# Altium footprint library Face_InMain1V0.PcbLib: 83 footprints (part 2 of 6)
Each footprint in its own frame and in the unit in brackets; x right, y up, seen from the top. Pads: shape width x height; smd on the part's side, far side on the other; paste and mask are expansions set on the pad; w line width, h text height; cw(c..) or ccw(c..) is an arc to the next point about the centre after c.
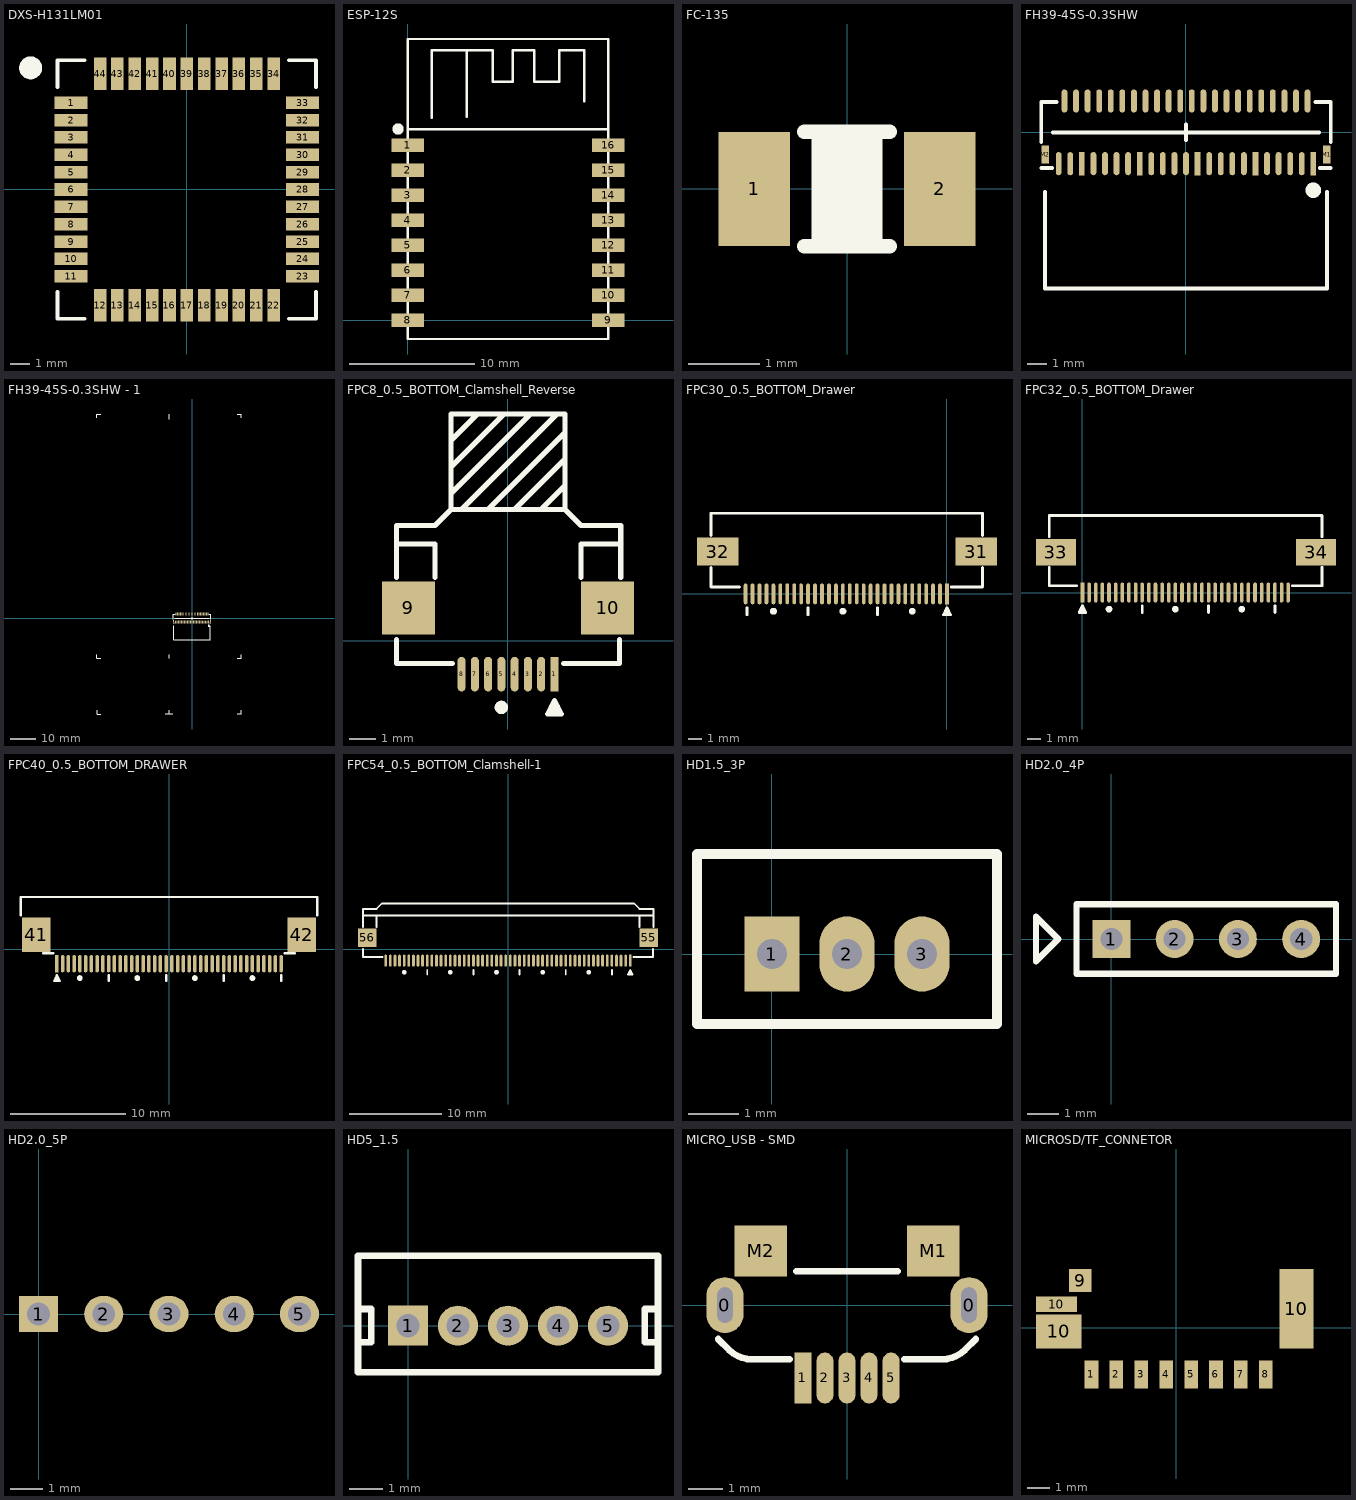
[diagram p1: the footprints below, top view; thin cyan lines are the x and y axes]

## DXS-H131LM01 [mm] "DXS-H131LM01"
height 6.3
pads (45):
  rect 1.7x0.65 smd paste+0 mask+0: 1(-6,4.5) 2(-6,3.6) 3(-6,2.7) 4(-6,1.8) 5(-6,0.9) 6(-6,0) 7(-6,-0.9) 8(-6,-1.8) 9(-6,-2.7) 10(-6,-3.6) 11(-6,-4.5) 23(6,-4.5) 24(6,-3.6) 25(6,-2.7) 26(6,-1.8) 27(6,-0.9) 28(6,0) 29(6,0.9) 30(6,1.8) 31(6,2.7) 32(6,3.6) 33(6,4.5)
  rect 0.65x1.7 smd paste+0 mask+0: 12(-4.5,-6) 13(-3.6,-6) 14(-2.7,-6) 15(-1.8,-6) 16(-0.9,-6) 17(0,-6) 18(0.9,-6) 19(1.8,-6) 20(2.7,-6) 21(3.6,-6) 22(4.5,-6) 34(4.5,6) 35(3.6,6) 36(2.7,6) 37(1.8,6) 38(0.9,6) 39(0,6) 40(-0.9,6) 41(-1.8,6) 42(-2.7,6) 43(-3.6,6) 44(-4.5,6)
  round 1.2 on Top Overlay paste+0 mask+0: ""(-8.1,6.3)
Top Overlay:
  lines w0.2: -6.7,-5.3 -6.7,-6.7 -5.3,-6.7 ; -6.7,5.3 -6.7,6.7 -5.3,6.7 ; 5.3,-6.7 6.7,-6.7 6.7,-5.3 ; 5.3,6.7 6.7,6.7 6.7,5.3

## ESP-12S [mm]
pads (16):
  rect 2.6x1.1 smd: 1(0,14) 2(0,12) 3(0,10) 4(0,8) 5(0,6) 6(0,4) 7(0,2) 8(0,0) 9(16,0) 10(16,2) 11(16,4) 12(16,6) 13(16,8) 14(16,10) 15(16,12) 16(16,14)
Top Overlay:
  circle w0.5: c-0.8,15.3 r0.2
  lines w0.2: 0,15.3 16,15.3 ; 1.9,16.2 1.9,21.6 4.7,21.6 ; 4.7,16.3 4.7,21.6 ; 14.1,17.5 14.1,21.6 12.1,21.6 12.1,19.1 10.1,19.1 10.1,21.6 8.4,21.6 8.4,19.1 6.8,19.1 6.8,21.6 4.7,21.6 ; 0,-1.5 16,-1.5 16,22.5 0,22.5 0,-1.5
3D body "User Library-esp-12s.STEP": height 3.15, standoff 0.03, extent 0,-1.5 16,22.5

## FC-135 [mm]
pads (2):
  rect 1x1.6 smd paste+0 mask+0.102: 1(-1.3,0) 2(1.3,0)
Top Overlay:
  rectangle: -0.5,-0.8 0.5,0.8
  lines w0.2: -0.6,-0.8 0.6,-0.8 ; -0.6,0.8 0.6,0.8

## FH39-45S-0.3SHW [mm] "FH35C-33S-0.3SHW(50) Hirose"
height 0.9
pads (47):
  rect 0.3x1.2 smd: 1(6.6,-1.625) 11(3.6,-1.625) 21(0.6,-1.625) 31(-2.4,-1.625) 41(-5.4,-1.625)
  oval 0.3x1.2 smd: 2(6.3,1.625) 3(6,-1.625) 4(5.7,1.625) 5(5.4,-1.625) 6(5.1,1.625) 7(4.8,-1.625) 8(4.5,1.625) 9(4.2,-1.625) 10(3.9,1.625) 12(3.3,1.625) 13(3,-1.625) 14(2.7,1.625) 15(2.4,-1.625) 16(2.1,1.625) 17(1.8,-1.625) 18(1.5,1.625) 19(1.2,-1.625) 20(0.9,1.625) 22(0.3,1.625) 23(0,-1.625) 24(-0.3,1.625) 25(-0.6,-1.625) 26(-0.9,1.625) 27(-1.2,-1.625) 28(-1.5,1.625) 29(-1.8,-1.625) 30(-2.1,1.625) 32(-2.7,1.625) 33(-3,-1.625) 34(-3.3,1.625) 35(-3.6,-1.625) 36(-3.9,1.625) 37(-4.2,-1.625) 38(-4.5,1.625) 39(-4.8,-1.625) 40(-5.1,1.625) 42(-5.7,1.625) 43(-6,-1.625) 44(-6.3,1.625) 45(-6.6,-1.625)
  rect 0.4x0.95 smd: M1(7.3,-1.15) M2(-7.3,-1.15)
Top Overlay:
  circle w0.4: c6.6,-3 r0.2
  lines w0.2: -7.5,-1.85 -6.95,-1.85 ; -7.5,-0.5 -7.5,1.575 -6.7,1.575 ; -7.3,-3.1 -7.3,-8.1 7.3,-8.1 7.3,-3.1 ; -6.9,0 6.9,0 ; 0,-0.392 0,0.408 ; 6.7,1.575 7.5,1.575 ; 6.95,-1.85 7.5,-1.85 ; 7.5,-0.5 7.5,1.575 ; 7.5,1.575 7.5,1.575
3D body "s10061122-451420hlf.stp": height 0.9, standoff 0, extent -7.65,-1.7 7.65,1.79

## FH39-45S-0.3SHW - 1 [mm] "FH35C-33S-0.3SHW(50) Hirose"
height 0.9
pads (47):
  rect 0.3x1.2 smd: 1(6.6,-1.625) 11(3.6,-1.625) 21(0.6,-1.625) 31(-2.4,-1.625) 41(-5.4,-1.625)
  oval 0.3x1.2 smd: 2(6.3,1.625) 3(6,-1.625) 4(5.7,1.625) 5(5.4,-1.625) 6(5.1,1.625) 7(4.8,-1.625) 8(4.5,1.625) 9(4.2,-1.625) 10(3.9,1.625) 12(3.3,1.625) 13(3,-1.625) 14(2.7,1.625) 15(2.4,-1.625) 16(2.1,1.625) 17(1.8,-1.625) 18(1.5,1.625) 19(1.2,-1.625) 20(0.9,1.625) 22(0.3,1.625) 23(0,-1.625) 24(-0.3,1.625) 25(-0.6,-1.625) 26(-0.9,1.625) 27(-1.2,-1.625) 28(-1.5,1.625) 29(-1.8,-1.625) 30(-2.1,1.625) 32(-2.7,1.625) 33(-3,-1.625) 34(-3.3,1.625) 35(-3.6,-1.625) 36(-3.9,1.625) 37(-4.2,-1.625) 38(-4.5,1.625) 39(-4.8,-1.625) 40(-5.1,1.625) 42(-5.7,1.625) 43(-6,-1.625) 44(-6.3,1.625) 45(-6.6,-1.625)
  rect 0.4x0.95 smd: M1(7.3,-1.15) M2(-7.3,-1.15)
Top Overlay:
  circle w0.4: c6.6,-3 r0.2
  lines w0.2: -37.7,-14.5 -37.7,-16 -36.2,-16 ; -37.7,79.4 -37.7,80.9 -36.2,80.9 ; -37.65,-36.5 -37.65,-38 -36.15,-38 ; -10.6,-38 -9.1,-38 ; -9.125,-16 -9.125,-14.5 ; -9.125,78.9 -9.125,79.9 -9.125,80.9 ; -9.1,-36.5 -9.1,-38 ; -7.6,-38 -9.1,-38 ; -7.5,-1.85 -6.95,-1.85 ; -7.5,-0.5 -7.5,1.575 -6.7,1.575 ; -7.3,-3.1 -7.3,-8.5 7.3,-8.5 7.3,-3.1 ; -6.9,0 6.9,0 ; 0,-0.392 0,0.408 ; 6.7,1.575 7.5,1.575 ; 6.95,-1.85 7.5,-1.85 ; 7.5,-0.5 7.5,1.575 ; 17.95,-38 19.45,-38 19.45,-36.5 ; 17.95,-16 19.45,-16 19.45,-14.5 ; 17.95,80.9 19.45,80.9 19.45,79.4 ; 7.5,1.575 7.5,1.575

## FPC8_0.5_BOTTOM_Clamshell_Reverse [mm]
pads (10):
  rect 0.3x1.3 smd mask+0.03: 1(1.75,-1.25)
  oval 0.3x1.3 smd mask+0.03: 2(1.25,-1.25) 3(0.75,-1.25) 4(0.25,-1.25) 5(-0.25,-1.25) 6(-0.75,-1.25) 7(-1.25,-1.25) 8(-1.75,-1.25)
  rect 2x2 smd: 9(-3.75,1.25) 10(3.75,1.25)
Top Overlay:
  circle w0.25: c-0.25,-2.5 r0.125
  lines w0.2: -4.2,0.05 -4.2,-0.85 -2.1,-0.85 ; -4.2,2.4 -4.2,3.65 ; -2.75,2.4 -2.75,3.65 -4.2,3.65 ; -2.15,5.55 0.85,8.55 ; -2.15,6.55 -0.15,8.55 ; -2.15,7.55 -1.15,8.55 ; -1.75,4.95 1.85,8.55 ; -0.75,4.95 2.15,7.85 ; 0.25,4.95 2.15,6.85 ; 1.25,4.95 2.15,5.85 ; 1.65,-2.75 1.65,-2.45 ; 1.75,-2.75 1.75,-2.25 ; 1.85,-2.75 1.85,-2.45 ; 2.1,-0.85 4.2,-0.85 4.2,0.05 ; 2.75,2.4 2.75,3.65 4.25,3.65 ; 4.25,2.4 4.25,3.65 ; -4.2,3.65 -4.2,4.35 -2.75,4.35 -2.15,4.95 ; -2.15,4.95 2.15,4.95 ; -2.15,4.95 -2.15,8.55 2.15,8.55 2.15,4.95 ; 1.75,-2.25 2,-2.75 1.5,-2.75 1.75,-2.25 ; 2.15,4.95 2.75,4.35 4.25,4.35 4.25,3.65
3D body "FPC0.5_8P.STEP": height 1.94, standoff -0.01, extent -4.2,-1.35 4.2,4.95

## FPC30_0.5_BOTTOM_Drawer [mm]
pads (32):
  rect 0.27x1.5 smd mask+0.05: 1(0,0)
  oval 0.27x1.5 smd mask+0.05: 2(-0.5,0) 3(-1,0) 4(-1.5,0) 5(-2,0) 6(-2.5,0) 7(-3,0) 8(-3.5,0) 9(-4,0) 10(-4.5,0) 11(-5,0) 12(-5.5,0) 13(-6,0) 14(-6.5,0) 15(-7,0) 16(-7.5,0) 17(-8,0) 18(-8.5,0) 19(-9,0) 20(-9.5,0) 21(-10,0) 22(-10.5,0) 23(-11,0) 24(-11.5,0) 25(-12,0) 26(-12.5,0) 27(-13,0) 28(-13.5,0) 29(-14,0) 30(-14.5,0)
  rect 3x2 smd mask+0.05: 31(2.1,3.05) 32(-16.5,3.05)
Top Overlay:
  circle w0.25: c-2.5,-1.25 r0.125
  circle w0.25: c-7.5,-1.25 r0.125
  circle w0.25: c-12.5,-1.25 r0.125
  lines w0.2: -17,1.9 -17,0.5 -14.95,0.5 ; -17,4.2 -17,5.8 2.55,5.8 2.55,4.2 ; -14.4,-1.5 -14.4,-1 ; -10,-1.5 -10,-1 ; -5,-1.5 -5,-1 ; -0.1,-1.5 -0.1,-1.2 ; 0,-1.5 0,-1 ; 0.1,-1.5 0.1,-1.2 ; 0.3,0.5 2.5,0.5 ; 2.55,0.5 2.55,1.9 ; 0,-1 -0.25,-1.5 0.25,-1.5 0,-1
3D body "31810.stp": height 2.6, standoff 0.05, extent -17.2,-0.43 2.7,6.77

## FPC32_0.5_BOTTOM_Drawer [mm]
pads (34):
  rect 0.27x1.5 smd mask+0.05: 1(0,0)
  oval 0.27x1.5 smd mask+0.05: 2(0.5,0) 3(1,0) 4(1.5,0) 5(2,0) 6(2.5,0) 7(3,0) 8(3.5,0) 9(4,0) 10(4.5,0) 11(5,0) 12(5.5,0) 13(6,0) 14(6.5,0) 15(7,0) 16(7.5,0) 17(8,0) 18(8.5,0) 19(9,0) 20(9.5,0) 21(10,0) 22(10.5,0) 23(11,0) 24(11.5,0) 25(12,0) 26(12.5,0) 27(13,0) 28(13.5,0) 29(14,0) 30(14.5,0) 31(15,0) 32(15.5,0)
  rect 3x2 smd mask+0.05: 33(-2,3.05) 34(17.6,3.05)
Top Overlay:
  circle w0.25: c12,-1.25 r0.125
  circle w0.25: c7,-1.25 r0.125
  circle w0.25: c2,-1.25 r0.125
  lines w0.2: -2.5,1.9 -2.5,0.5 -0.45,0.5 ; -2.5,4.2 -2.5,5.8 18.05,5.8 18.05,4.2 ; -0.1,-1.5 -0.1,-1.2 ; 0,-1.5 0,-1 ; 0.1,-1.5 0.1,-1.2 ; 4.5,-1.5 4.5,-1 ; 9.5,-1.5 9.5,-1 ; 14.5,-1.5 14.5,-1 ; 15.8,0.5 18,0.5 ; 18.05,0.5 18.05,1.9 ; 0,-1 -0.25,-1.5 0.25,-1.5 0,-1
3D body "31790.stp": height 2.14, standoff 0.04, extent -2.303,-0.431 17.797,5.969

## FPC40_0.5_BOTTOM_DRAWER [mm]
pads (42):
  rect 0.3x1.5 smd: 1(-9.75,-1.262)
  oval 0.3x1.5 smd: 2(-9.25,-1.262) 3(-8.75,-1.262) 4(-8.25,-1.262) 5(-7.75,-1.262) 6(-7.25,-1.262) 7(-6.75,-1.262) 8(-6.25,-1.262) 9(-5.75,-1.262) 10(-5.25,-1.262) 11(-4.75,-1.262) 12(-4.25,-1.262) 13(-3.75,-1.262) 14(-3.25,-1.262) 15(-2.75,-1.262) 16(-2.25,-1.262) 17(-1.75,-1.262) 18(-1.25,-1.262) 19(-0.75,-1.262) 20(-0.25,-1.262) 21(0.25,-1.262) 22(0.75,-1.262) 23(1.25,-1.262) 24(1.75,-1.262) 25(2.25,-1.263) 26(2.75,-1.262) 27(3.25,-1.262) 28(3.75,-1.262) 29(4.25,-1.262) 30(4.75,-1.262) 31(5.25,-1.262) 32(5.75,-1.262) 33(6.25,-1.262) 34(6.75,-1.262) 35(7.25,-1.262) 36(7.75,-1.262) 37(8.25,-1.262) 38(8.75,-1.262) 39(9.25,-1.262) 40(9.75,-1.262)
  rect 2.5x3 smd: 41(-11.54,1.263) 42(11.54,1.263)
Top Overlay:
  circle w0.25: c-7.75,-2.512 r0.125
  circle w0.25: c-2.75,-2.512 r0.125
  circle w0.25: c2.25,-2.512 r0.125
  circle w0.25: c7.25,-2.512 r0.125
  lines w0.2: -12.9,2.938 -12.9,4.538 12.9,4.538 12.9,2.938 ; -10.95,-0.362 -10.05,-0.362 ; -9.85,-2.762 -9.85,-2.462 ; -9.75,-2.762 -9.75,-2.262 ; -9.65,-2.762 -9.65,-2.462 ; -5.25,-2.762 -5.25,-2.262 ; -0.25,-2.762 -0.25,-2.262 ; 4.75,-2.762 4.75,-2.262 ; 9.75,-2.762 9.75,-2.262 ; 10.05,-0.362 10.95,-0.362 ; -9.75,-2.262 -9.5,-2.762 -10,-2.762 -9.75,-2.262
3D body "FPC40.STEP": height 2, standoff 0, extent -12.12,-1.451 12.1,4.658

## FPC54_0.5_BOTTOM_Clamshell-1 [mm]
pads (56):
  rect 0.3x1.3 smd: 1(13.25,-1.25)
  oval 0.3x1.3 smd: 2(12.75,-1.25) 3(12.25,-1.25) 4(11.75,-1.25) 5(11.25,-1.25) 6(10.75,-1.25) 7(10.25,-1.25) 8(9.75,-1.25) 9(9.25,-1.25) 10(8.75,-1.25) 11(8.25,-1.25) 12(7.75,-1.25) 13(7.25,-1.25) 14(6.75,-1.25) 15(6.25,-1.25) 16(5.75,-1.25) 17(5.25,-1.25) 18(4.75,-1.25) 19(4.25,-1.25) 20(3.75,-1.25) 21(3.25,-1.25) 22(2.75,-1.25) 23(2.25,-1.25) 24(1.75,-1.25) 25(1.25,-1.25) 26(0.75,-1.25) 27(0.25,-1.25) 28(-0.25,-1.25) 29(-0.75,-1.25) 30(-1.25,-1.25) 31(-1.75,-1.25) 32(-2.25,-1.25) 33(-2.75,-1.25) 34(-3.25,-1.25) 35(-3.75,-1.25) 36(-4.25,-1.25) 37(-4.75,-1.25) 38(-5.25,-1.25) 39(-5.75,-1.25) 40(-6.25,-1.25) 41(-6.75,-1.25) 42(-7.25,-1.25) 43(-7.75,-1.25) 44(-8.25,-1.25) 45(-8.75,-1.25) 46(-9.25,-1.25) 47(-9.75,-1.25) 48(-10.25,-1.25) 49(-10.75,-1.25) 50(-11.25,-1.25) 51(-11.75,-1.25) 52(-12.25,-1.25) 53(-12.75,-1.25) 54(-13.25,-1.25)
  rect 2x2 smd: 55(15.25,1.25) 56(-15.25,1.25)
Top Overlay:
  circle w0.25: c3.75,-2.5 r0.125
  circle w0.25: c-1.25,-2.5 r0.125
  circle w0.25: c-6.25,-2.5 r0.125
  circle w0.25: c-11.25,-2.5 r0.125
  circle w0.25: c8.75,-2.5 r0.125
  lines w0.2: -15.7,0.05 -15.7,-0.85 -13.6,-0.85 ; -15.7,2.4 -15.7,3.65 ; -14.25,2.4 -14.25,3.65 ; -8.75,-2.75 -8.75,-2.25 ; -3.75,-2.75 -3.75,-2.25 ; 1.25,-2.75 1.25,-2.25 ; 6.25,-2.75 6.25,-2.25 ; 11.25,-2.75 11.25,-2.25 ; 13.15,-2.75 13.15,-2.45 ; 13.25,-2.75 13.25,-2.25 ; 13.35,-2.75 13.35,-2.45 ; 13.6,-0.85 15.7,-0.85 15.7,0.05 ; 14.25,2.4 14.25,3.65 ; 15.75,2.4 15.75,3.65 ; -15.7,3.65 -15.7,4.35 -14.25,4.35 -13.65,4.95 13.65,4.95 14.25,4.35 15.75,4.35 15.75,3.65 ; -15.7,3.65 -14.25,3.65 ; -14.25,3.65 14.25,3.65 ; 13.25,-2.25 13,-2.75 13.5,-2.75 13.25,-2.25 ; 14.25,3.65 15.75,3.65
3D body "FPC54.STEP": height 2, standoff 0, extent -15.61,-1.55 15.61,4.56

## HD1.5_3P [mm]
pads (3):
  rect 1.1x1.5 hole 0.6: 1(0,0)
  oval 1.1x1.5 hole 0.6: 2(1.5,0) 3(3,0)
Top Overlay:
  lines w0.2: -1.5,-1.4 -1.5,2 4.5,2 4.5,-1.4 -1.5,-1.4

## HD2.0_4P [mm]
pads (4):
  rect 1.2x1.2 hole 0.7: 1(0,0)
  round 1.2 hole 0.7: 2(2,0) 3(4,0) 4(6,0)
Top Overlay:
  lines w0.2: -2.381,-0.7 -1.681,0 -2.381,0.7 -2.381,-0.7 ; -1.1,-1.1 7.1,-1.1 7.1,1.1 -1.1,1.1 -1.1,-1.1

## HD2.0_5P [mm]
height 6.1
pads (5):
  rect 1.2x1.1 hole 0.7: 1(0,0)
  oval 1.2x1.1 hole 0.7: 2(2,0) 3(4,0) 4(6,0) 5(8,0)

## HD5_1.5 [mm]
pads (5):
  rect 1.2x1.2 hole 0.7: 1(0,0)
  round 1.2 hole 0.7: 2(1.5,0) 3(3,0) 4(4.5,0) 5(6,0)
Top Overlay:
  lines w0.2: -1.5,-0.5 -1.1,-0.5 -1.1,0.5 -1.5,0.5 ; 7.5,-0.5 7.1,-0.5 7.1,0.5 7.5,0.5 ; -1.5,-1.4 -1.5,2.1 7.5,2.1 7.5,-1.4 -1.5,-1.4
Bottom Overlay:
  lines w0.2: -0.762,-0.762 0.762,-0.762 0.762,0.762 -0.762,0.762 -0.762,-0.762

## MICRO_USB - SMD [mm]
pads (9):
  oval 1.1x1.65 hole 1.05 slot 0.45 at 0 deg: 0(-3.6,0) 0(3.6,0)
  rect 0.5x1.5 smd mask+0.01: 1(-1.3,-2.15)
  oval 0.5x1.5 smd mask+0.01: 2(-0.65,-2.15) 3(0,-2.15) 4(0.65,-2.15) 5(1.3,-2.15)
  rect 1.55x1.5 smd: M1(2.55,1.6) M2(-2.55,1.6)
Top Overlay:
  lines w0.2: -3.8,-1 -3.483,-1.317 ccw(c-2.8,-0.634) -2.8,-1.6 -1.7,-1.6 ; -1.5,1 1.5,1 ; 1.7,-1.6 2.8,-1.6 ccw(c2.8,-0.634) 3.483,-1.317 3.8,-1
3D body "Micro USB B SMT vertical.STEP": height 6.74, standoff 0.03, extent -4.025,-1.785 3.975,1.23

## MICROSD/TF_CONNETOR [mm]
pads (12):
  rect 0.6x1.25 smd mask+0.05: 1(-3.75,-2.075) 2(-2.65,-2.075) 3(-1.55,-2.075) 4(-0.45,-2.075) 5(0.65,-2.075) 6(1.75,-2.075) 7(2.85,-2.075) 8(3.95,-2.075)
  rect 1x1 smd mask+0.05: 9(-4.25,2.075)
  rect 1.8x0.7 smd mask+0.05: 10(-5.3,1.025)
  rect 2x1.5 smd mask+0.05: 10(-5.2,-0.175)
  rect 1.5x3.5 smd mask+0.05: 10(5.3,0.825)
Mechanical 13:
  pour cut-out: -2.48,3.894
3D body "0475710001.stp": height 2.4, standoff 0, extent -5.75,-3.125 5.78,2.335